# Altium footprint library common.PcbLib: 552 footprints (part 3 of 35)
Each footprint in its own frame and in the unit in brackets; x right, y up, seen from the top. Pads: shape width x height; smd on the part's side, far side on the other; paste and mask are expansions set on the pad; w line width, h text height; cw(c..) or ccw(c..) is an arc to the next point about the centre after c.
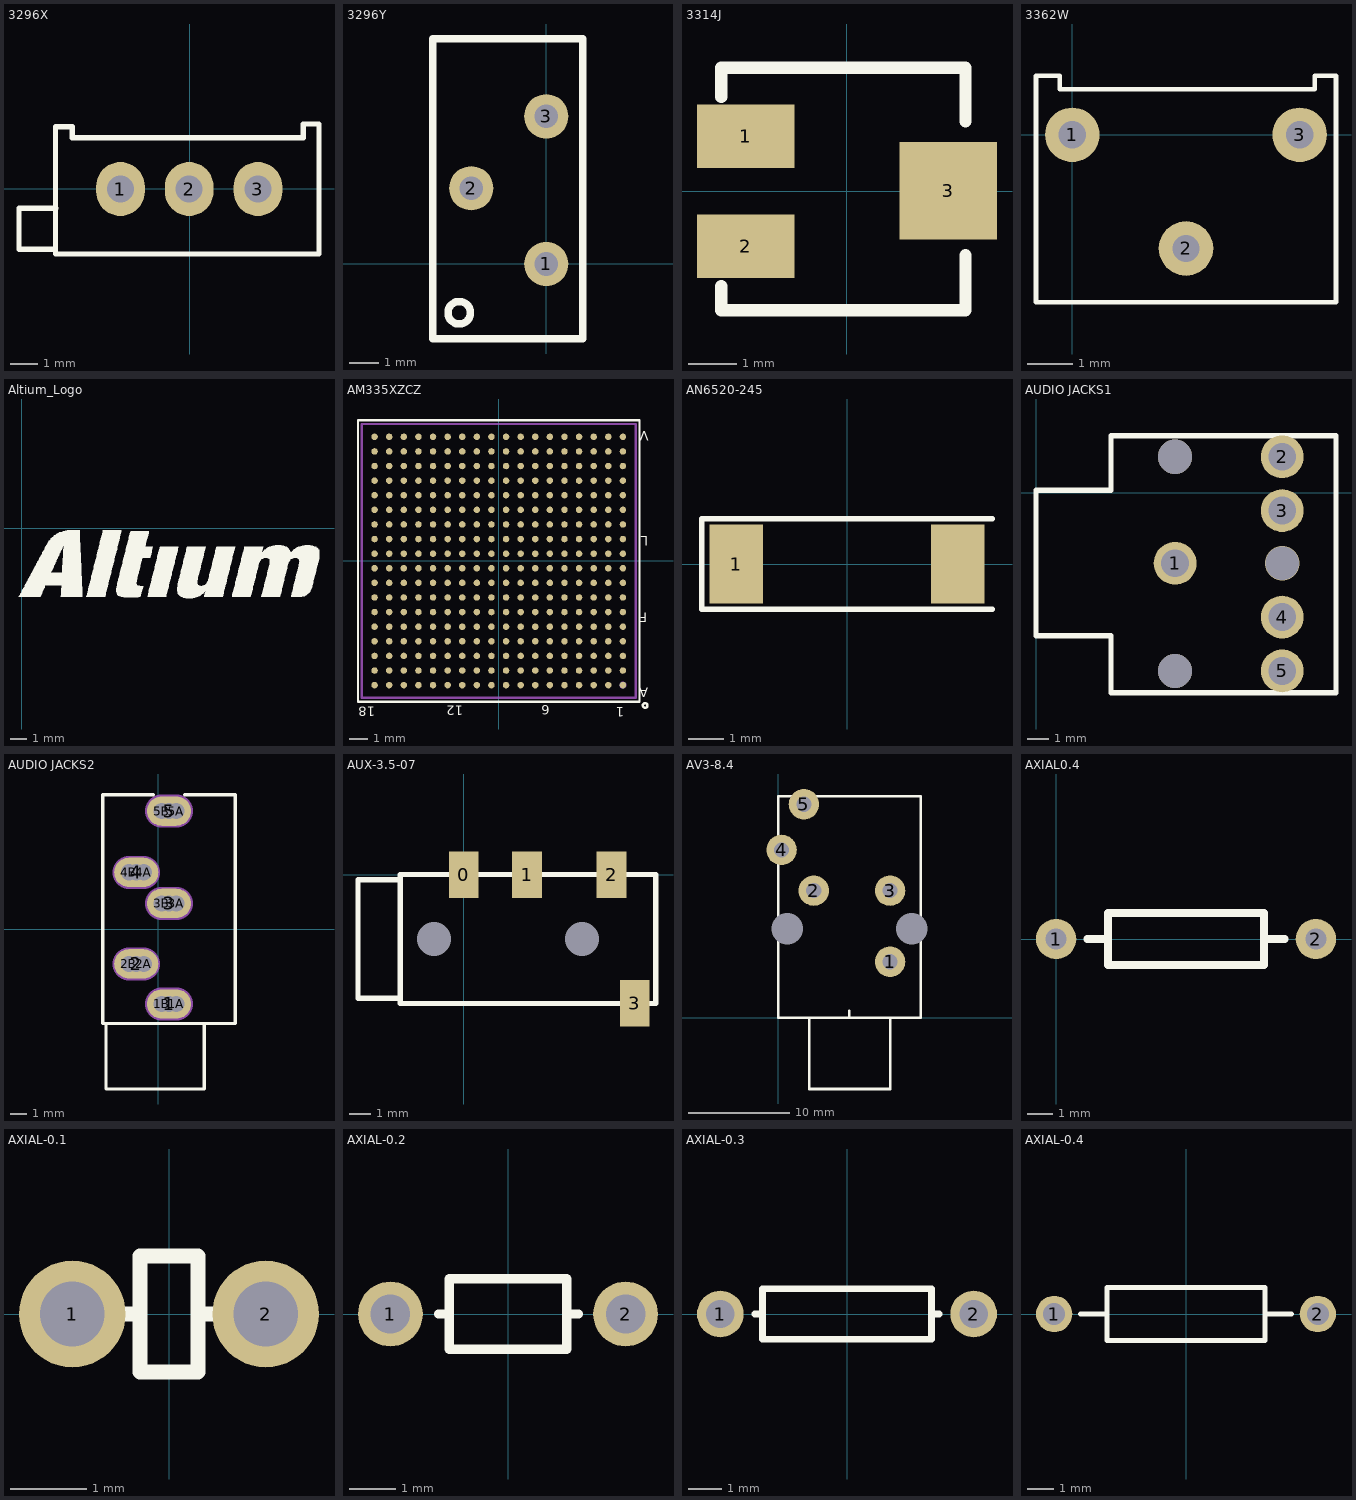
[diagram p2: the footprints below, top view; thin cyan lines are the x and y axes]

## 3296X [mm]
pads (3):
  oval 1.8x2 hole 1: 1(-2.561,-0.001) 2(-0.021,-0.001) 3(2.519,-0.001)
Top Overlay:
  lines w0.2: -5.031,-2.234 -6.309,-2.234 -6.309,-0.717 -4.959,-0.717 ; -4.962,-2.401 -4.962,2.299 -4.339,2.299 -4.339,1.899 -2.861,1.899 -2.261,1.899 -0.321,1.899 0.279,1.899 2.219,1.899 2.819,1.899 4.187,1.899 4.187,2.399 4.775,2.399 4.775,-2.401 3.779,-2.401 -3.821,-2.401 -4.962,-2.401
Mechanical 11:
  circle w0.1: c-2.561,0.009 r0.25
  circle w0.1: c-0.021,0.009 r0.25
  circle w0.1: c2.519,0.009 r0.25
3D body: height 10.03, standoff -2.22, extent -6.301,-2.425 4.749,2.405

## 3296Y [mm]
pads (3):
  round 1.5 hole 0.8: 1(0,0) 2(-2.54,2.565) 3(0,5)
Top Overlay:
  circle w0.254: c-2.946,-1.651 r0.381
  lines w0.254: -3.835,-2.54 -3.835,7.62 1.245,7.62 1.245,-2.54 -3.835,-2.54
3D body: height 11.55, standoff -2.1, extent -3.695,-2.225 1.105,7.305

## 3314J [mm]
pads (3):
  rect 2x1.3 smd: 1(-2.072,1.124) 2(-2.072,-1.124)
  rect 2x2 smd: 3(2.072,0.007)
Top Overlay:
  lines w0.254: -2.578,-1.95 -2.578,-2.436 2.427,-2.436 2.427,-1.31 ; -2.578,1.93 -2.578,2.528 2.427,2.528 2.427,1.429
3D body: height 2.67, standoff -0.06, extent -2.54,-2.423 2.464,2.576

## 3362W [mm]
pads (3):
  round 1.2 hole 0.6: 1(0,0) 2(2.5,-2.5) 3(5,0)
Top Overlay:
  lines w0.1: -0.8,-3.683 5.8,-3.683 5.8,1.3 5.334,1.3 5.334,1 0.864,1 -0.279,1 -0.279,1.3 -0.8,1.3 -0.8,-3.683
3D body: height 7.1, standoff -5.4, extent -0.76,-3.582 5.84,1.118

## Altium_Logo [mm]
Top Overlay:
  drawing of 1243 lines, arcs and shapes, not listed

## AM335XZCZ [mil] "AM335XZCZ"
pads (324):
  round 14 smd: A1(267.72,-267.72) A2(236.22,-267.72) A3(204.72,-267.72) A4(173.23,-267.72) A5(141.73,-267.72) A6(110.24,-267.72) A7(78.74,-267.72) A8(47.24,-267.72) A9(15.75,-267.72) A10(-15.75,-267.72) A11(-47.24,-267.72) A12(-78.74,-267.72) A13(-110.24,-267.72) A14(-141.73,-267.72) A15(-173.23,-267.72) A16(-204.72,-267.72) A17(-236.22,-267.72) A18(-267.72,-267.72) B1(267.72,-236.22) B2(236.22,-236.22) B3(204.72,-236.22) B4(173.23,-236.22) B5(141.73,-236.22) B6(110.24,-236.22) B7(78.74,-236.22) B8(47.24,-236.22) B9(15.75,-236.22) B10(-15.75,-236.22) B11(-47.24,-236.22) B12(-78.74,-236.22) B13(-110.24,-236.22) B14(-141.73,-236.22) B15(-173.23,-236.22) B16(-204.72,-236.22) B17(-236.22,-236.22) B18(-267.72,-236.22) C1(267.72,-204.72) C2(236.22,-204.72) C3(204.72,-204.72) C4(173.23,-204.72) C5(141.73,-204.72) C6(110.24,-204.72) C7(78.74,-204.72) C8(47.24,-204.72) C9(15.75,-204.72) C10(-15.75,-204.72) C11(-47.24,-204.72) C12(-78.74,-204.72) C13(-110.24,-204.72) C14(-141.73,-204.72) C15(-173.23,-204.72) C16(-204.72,-204.72) C17(-236.22,-204.72) C18(-267.72,-204.72) D1(267.72,-173.23) D2(236.22,-173.23) D3(204.72,-173.23) D4(173.23,-173.23) D5(141.73,-173.23) D6(110.24,-173.23) D7(78.74,-173.23) D8(47.24,-173.23) D9(15.75,-173.23) D10(-15.75,-173.23) D11(-47.24,-173.23) D12(-78.74,-173.23) D13(-110.24,-173.23) D14(-141.73,-173.23) D15(-173.23,-173.23) D16(-204.72,-173.23) D17(-236.22,-173.23) D18(-267.72,-173.23) E1(267.72,-141.73) E2(236.22,-141.73) E3(204.72,-141.73) E4(173.23,-141.73) E5(141.73,-141.73) E6(110.24,-141.73) E7(78.74,-141.73) E8(47.24,-141.73) E9(15.75,-141.73) E10(-15.75,-141.73) E11(-47.24,-141.73) E12(-78.74,-141.73) E13(-110.24,-141.73) E14(-141.73,-141.73) E15(-173.23,-141.73) E16(-204.72,-141.73) E17(-236.22,-141.73) E18(-267.72,-141.73) F1(267.72,-110.24) F2(236.22,-110.24) F3(204.72,-110.24) F4(173.23,-110.24) F5(141.73,-110.24) F6(110.24,-110.24) F7(78.74,-110.24) F8(47.24,-110.24) F9(15.75,-110.24) F10(-15.75,-110.24) F11(-47.24,-110.24) F12(-78.74,-110.24) F13(-110.24,-110.24) F14(-141.73,-110.24) F15(-173.23,-110.24) F16(-204.72,-110.24) F17(-236.22,-110.24) F18(-267.72,-110.24) G1(267.72,-78.74) G2(236.22,-78.74) G3(204.72,-78.74) G4(173.23,-78.74) G5(141.73,-78.74) G6(110.24,-78.74) G7(78.74,-78.74) G8(47.24,-78.74) G9(15.75,-78.74) G10(-15.75,-78.74) G11(-47.24,-78.74) G12(-78.74,-78.74) G13(-110.24,-78.74) G14(-141.73,-78.74) G15(-173.23,-78.74) G16(-204.72,-78.74) G17(-236.22,-78.74) G18(-267.72,-78.74) H1(267.72,-47.24) H2(236.22,-47.24) H3(204.72,-47.24) H4(173.23,-47.24) H5(141.73,-47.24) H6(110.24,-47.24) H7(78.74,-47.24) H8(47.24,-47.24) H9(15.75,-47.24) H10(-15.75,-47.24) H11(-47.24,-47.24) H12(-78.74,-47.24) H13(-110.24,-47.24) H14(-141.73,-47.24) H15(-173.23,-47.24) H16(-204.72,-47.24) H17(-236.22,-47.24) H18(-267.72,-47.24) J1(267.72,-15.75) J2(236.22,-15.75) J3(204.72,-15.75) J4(173.23,-15.75) J5(141.73,-15.75) J6(110.24,-15.75) J7(78.74,-15.75) J8(47.24,-15.75) J9(15.75,-15.75) J10(-15.75,-15.75) J11(-47.24,-15.75) J12(-78.74,-15.75) J13(-110.24,-15.75) J14(-141.73,-15.75) J15(-173.23,-15.75) J16(-204.72,-15.75) J17(-236.22,-15.75) J18(-267.72,-15.75) K1(267.72,15.75) K2(236.22,15.75) K3(204.72,15.75) K4(173.23,15.75) K5(141.73,15.75) K6(110.24,15.75) K7(78.74,15.75) K8(47.24,15.75) K9(15.75,15.75) K10(-15.75,15.75) K11(-47.24,15.75) K12(-78.74,15.75) K13(-110.24,15.75) K14(-141.73,15.75) K15(-173.23,15.75) K16(-204.72,15.75) K17(-236.22,15.75) K18(-267.72,15.75) L1(267.72,47.24) L2(236.22,47.24) L3(204.72,47.24) L4(173.23,47.24) L5(141.73,47.24) L6(110.24,47.24) L7(78.74,47.24) L8(47.24,47.24) L9(15.75,47.24) L10(-15.75,47.24) L11(-47.24,47.24) L12(-78.74,47.24) L13(-110.24,47.24) L14(-141.73,47.24) L15(-173.23,47.24) L16(-204.72,47.24) L17(-236.22,47.24) L18(-267.72,47.24) M1(267.72,78.74) M2(236.22,78.74) M3(204.72,78.74) M4(173.23,78.74) M5(141.73,78.74) M6(110.24,78.74) M7(78.74,78.74) M8(47.24,78.74) M9(15.75,78.74) M10(-15.75,78.74) M11(-47.24,78.74) M12(-78.74,78.74) M13(-110.24,78.74) M14(-141.73,78.74) M15(-173.23,78.74) M16(-204.72,78.74) M17(-236.22,78.74) M18(-267.72,78.74) N1(267.72,110.24) N2(236.22,110.24) N3(204.72,110.24) N4(173.23,110.24) N5(141.73,110.24) N6(110.24,110.24) N7(78.74,110.24) N8(47.24,110.24) N9(15.75,110.24) N10(-15.75,110.24) N11(-47.24,110.24) N12(-78.74,110.24) N13(-110.24,110.24) N14(-141.73,110.24) N15(-173.23,110.24) N16(-204.72,110.24) N17(-236.22,110.24) N18(-267.72,110.24) P1(267.72,141.73) P2(236.22,141.73) P3(204.72,141.73) P4(173.23,141.73) P5(141.73,141.73) P6(110.24,141.73) P7(78.74,141.73) P8(47.24,141.73) P9(15.75,141.73) P10(-15.75,141.73) P11(-47.24,141.73) P12(-78.74,141.73) P13(-110.24,141.73) P14(-141.73,141.73) P15(-173.23,141.73) P16(-204.72,141.73) P17(-236.22,141.73) P18(-267.72,141.73) R1(267.72,173.23) R2(236.22,173.23) R3(204.72,173.23) R4(173.23,173.23) R5(141.73,173.23) R6(110.24,173.23) R7(78.74,173.23) R8(47.24,173.23) R9(15.75,173.23) R10(-15.75,173.23) R11(-47.24,173.23) R12(-78.74,173.23) R13(-110.24,173.23) R14(-141.73,173.23) R15(-173.23,173.23) R16(-204.72,173.23) R17(-236.22,173.23) R18(-267.72,173.23) T1(267.72,204.72) T2(236.22,204.72) T3(204.72,204.72) T4(173.23,204.72) T5(141.73,204.72) T6(110.24,204.72) T7(78.74,204.72) T8(47.24,204.72) T9(15.75,204.72) T10(-15.75,204.72) T11(-47.24,204.72) T12(-78.74,204.72) T13(-110.24,204.72) T14(-141.73,204.72) T15(-173.23,204.72) T16(-204.72,204.72) T17(-236.22,204.72) T18(-267.72,204.72) U1(267.72,236.22) U2(236.22,236.22) U3(204.72,236.22) U4(173.23,236.22) U5(141.73,236.22) U6(110.24,236.22) U7(78.74,236.22) U8(47.24,236.22) U9(15.75,236.22) U10(-15.75,236.22) U11(-47.24,236.22) U12(-78.74,236.22) U13(-110.24,236.22) U14(-141.73,236.22) U15(-173.23,236.22) U16(-204.72,236.22) U17(-236.22,236.22) U18(-267.72,236.22) V1(267.72,267.72) V2(236.22,267.72) V3(204.72,267.72) V4(173.23,267.72) V5(141.73,267.72) V6(110.24,267.72) V7(78.74,267.72) V8(47.24,267.72) V9(15.75,267.72) V10(-15.75,267.72) V11(-47.24,267.72) V12(-78.74,267.72) V13(-110.24,267.72) V14(-141.73,267.72) V15(-173.23,267.72) V16(-204.72,267.72) V17(-236.22,267.72) V18(-267.72,267.72)
Top Overlay:
  circle w5: c315.67,-311.62 r5
  lines w5: -303.5,-303.5 -303.5,303.5 303.5,303.5 303.5,-303.5 -303.5,-303.5
  text "18" at -266.24,-314.49 h20.08
  text "12" at -76.87,-312.08 h20.08
  text "6" at 110.08,-310.87 h20.08
  text "L" at 322.19,52.93 h20.08
  text "F" at 319.96,-111.85 h20.08
  text "1" at 270.95,-315.2 h20.08
  text "V" at 323.32,279.77 h20.08
  text "A" at 322.86,-273.73 h20.08
Mechanical 13:
  text "J2" at 220.16,-15.75 h20.08
  text "L1" at 251.66,47.24 h20.08
  text "L2" at 220.16,47.24 h20.08
  text "B6" at 94.18,-236.22 h20.08
  text "D7" at 62.68,-173.23 h20.08
  text "C18" at -291.82,-204.72 h20.08
  text "F15" at -197.33,-110.24 h20.08
  text "P17" at -260.32,141.73 h20.08
  text "R18" at -291.82,173.23 h20.08
  text "R17" at -260.32,173.23 h20.08
  text "B4" at 157.17,-236.22 h20.08
  text "C17" at -260.32,-204.72 h20.08
  text "C16" at -228.82,-204.72 h20.08
  text "D6" at 94.18,-173.23 h20.08
  text "R13" at -134.34,173.23 h20.08
  text "D16" at -228.82,-173.23 h20.08
  text "D15" at -197.33,-173.23 h20.08
  text "J3" at 188.66,-15.75 h20.08
  text "E5" at 125.67,-141.73 h20.08
  text "J5" at 125.67,-15.75 h20.08
  text "K5" at 125.67,15.75 h20.08
  text "L5" at 125.67,47.24 h20.08
  text "G5" at 125.67,-78.74 h20.08
  text "F5" at 125.67,-110.24 h20.08
  text "H5" at 125.67,-47.24 h20.08
  text "E17" at -260.32,-141.73 h20.08
  text "J4" at 157.17,-15.75 h20.08
  text "E15" at -197.33,-141.73 h20.08
  text "G10" at -39.85,-78.74 h20.08
  text "H11" at -71.34,-47.24 h20.08
  text "M11" at -71.34,78.74 h20.08
  text "M13" at -134.34,78.74 h20.08
  text "N12" at -102.84,110.24 h20.08
  text "N13" at -134.34,110.24 h20.08
  text "K12" at -102.84,15.75 h20.08
  text "J12" at -102.84,-15.75 h20.08
  text "G6" at 94.18,-78.74 h20.08
  text "G7" at 62.68,-78.74 h20.08
  text "F6" at 94.18,-110.24 h20.08
  text "F7" at 62.68,-110.24 h20.08
  text "L8" at 31.18,47.24 h20.08
  text "L9" at -0.31,47.24 h20.08
  text "K8" at 31.18,15.75 h20.08
  text "L6" at 94.18,47.24 h20.08
  text "L7" at 62.68,47.24 h20.08
  text "K6" at 94.18,15.75 h20.08
  text "N9" at -0.31,110.24 h20.08
  text "N8" at 31.18,110.24 h20.08
  text "E16" at -228.82,-141.73 h20.08
  text "M1" at 251.66,78.74 h20.08
  text "L4" at 157.17,47.24 h20.08
  text "L3" at 188.66,47.24 h20.08
  text "K4" at 157.17,15.75 h20.08
  text "K3" at 188.66,15.75 h20.08
  text "K2" at 220.16,15.75 h20.08
  text "K1" at 251.66,15.75 h20.08
  text "J1" at 251.66,-15.75 h20.08
  text "P4" at 157.17,141.73 h20.08
  text "P3" at 188.66,141.73 h20.08
  text "A18" at -291.82,-267.72 h20.08
  text "V18" at -291.82,267.72 h20.08
  text "N11" at -71.34,110.24 h20.08
  text "N10" at -39.85,110.24 h20.08
  text "F8" at 31.18,-110.24 h20.08
  text "H7" at 62.68,-47.24 h20.08
  text "H6" at 94.18,-47.24 h20.08
  text "J7" at 62.68,-15.75 h20.08
  text "J6" at 94.18,-15.75 h20.08
  text "K7" at 62.68,15.75 h20.08
  text "H10" at -39.85,-47.24 h20.08
  text "J11" at -71.34,-15.75 h20.08
  text "J10" at -39.85,-15.75 h20.08
  text "K11" at -71.34,15.75 h20.08
  text "K10" at -39.85,15.75 h20.08
  text "M14" at -165.83,78.74 h20.08
  text "N14" at -165.83,110.24 h20.08
  text "L13" at -134.34,47.24 h20.08
  text "L12" at -102.84,47.24 h20.08
  text "M12" at -102.84,78.74 h20.08
  text "M10" at -39.85,78.74 h20.08
  text "L10" at -39.85,47.24 h20.08
  text "L11" at -71.34,47.24 h20.08
  text "M9" at -0.31,78.74 h20.08
  text "M8" at 31.18,78.74 h20.08
  text "M7" at 62.68,78.74 h20.08
  text "M6" at 94.18,78.74 h20.08
  text "N7" at 62.68,110.24 h20.08
  text "G8" at 31.18,-78.74 h20.08
  text "G9" at -0.31,-78.74 h20.08
  text "H8" at 31.18,-47.24 h20.08
  text "H9" at -0.31,-47.24 h20.08
  text "K9" at -0.31,15.75 h20.08
  text "J8" at 31.18,-15.75 h20.08
  text "J9" at -0.31,-15.75 h20.08
  text "V1" at 251.66,267.72 h20.08
  text "H12" at -102.84,-47.24 h20.08
  text "G11" at -71.34,-78.74 h20.08
  text "G12" at -102.84,-78.74 h20.08
  text "A1" at 251.66,-267.72 h20.08
  text "N4" at 157.17,110.24 h20.08
  text "N3" at 188.66,110.24 h20.08
  text "N2" at 220.16,110.24 h20.08
  text "N1" at 251.66,110.24 h20.08
  text "M4" at 157.17,78.74 h20.08
  text "M3" at 188.66,78.74 h20.08
  text "H4" at 157.17,-47.24 h20.08
  text "H3" at 188.66,-47.24 h20.08
  text "E3" at 188.66,-141.73 h20.08
  text "F2" at 220.16,-110.24 h20.08
  text "F4" at 157.17,-110.24 h20.08
  text "C1" at 251.66,-204.72 h20.08
  text "D4" at 157.17,-173.23 h20.08
  text "E2" at 220.16,-141.73 h20.08
  text "D5" at 125.67,-173.23 h20.08
  text "B1" at 251.66,-236.22 h20.08
  text "U17" at -260.32,236.22 h20.08
  text "C2" at 220.16,-204.72 h20.08
  text "T17" at -260.32,204.72 h20.08
  text "C3" at 188.66,-204.72 h20.08
  text "U18" at -291.82,236.22 h20.08
  text "E4" at 157.17,-141.73 h20.08
  text "T6" at 94.18,204.72 h20.08
  text "H1" at 251.66,-47.24 h20.08
  text "R7" at 62.68,173.23 h20.08
  text "F3" at 188.66,-110.24 h20.08
  text "A2" at 220.16,-267.72 h20.08
  text "J13" at -134.34,-15.75 h20.08
  text "G13" at -134.34,-78.74 h20.08
  text "H13" at -134.34,-47.24 h20.08
  text "F12" at -102.84,-110.24 h20.08
  text "F13" at -134.34,-110.24 h20.08
  text "F11" at -71.34,-110.24 h20.08
  text "F10" at -39.85,-110.24 h20.08
  text "T7" at 62.68,204.72 h20.08
  text "U6" at 94.18,236.22 h20.08
  text "V6" at 94.18,267.72 h20.08
  text "F17" at -260.32,-110.24 h20.08
  text "F18" at -291.82,-110.24 h20.08
  text "G16" at -228.82,-78.74 h20.08
  text "G18" at -291.82,-78.74 h20.08
  text "G17" at -260.32,-78.74 h20.08
  text "D14" at -165.83,-173.23 h20.08
  text "C10" at -39.85,-204.72 h20.08
  text "A15" at -197.33,-267.72 h20.08
  text "D11" at -71.34,-173.23 h20.08
  text "B18" at -291.82,-236.22 h20.08
  text "D9" at -0.31,-173.23 h20.08
  text "B5" at 125.67,-236.22 h20.08
  text "R5" at 125.67,173.23 h20.08
  text "A10" at -39.85,-267.72 h20.08
  text "U5" at 125.67,236.22 h20.08
  text "B15" at -197.33,-236.22 h20.08
  text "V5" at 125.67,267.72 h20.08
  text "N15" at -197.33,110.24 h20.08
  text "R15" at -197.33,173.23 h20.08
  text "G2" at 220.16,-78.74 h20.08
  text "G1" at 251.66,-78.74 h20.08
  text "P2" at 220.16,141.73 h20.08
  text "P1" at 251.66,141.73 h20.08
  text "M2" at 220.16,78.74 h20.08
  text "B2" at 220.16,-236.22 h20.08
  text "G4" at 157.17,-78.74 h20.08
  text "F1" at 251.66,-110.24 h20.08
  text "H2" at 220.16,-47.24 h20.08
  text "B14" at -165.83,-236.22 h20.08
  text "G3" at 188.66,-78.74 h20.08
  text "C14" at -165.83,-204.72 h20.08
  text "D1" at 251.66,-173.23 h20.08
  text "A11" at -71.34,-267.72 h20.08
  text "D2" at 220.16,-173.23 h20.08
  text "A12" at -102.84,-267.72 h20.08
  text "B11" at -71.34,-236.22 h20.08
  text "T5" at 125.67,204.72 h20.08
  text "C11" at -71.34,-204.72 h20.08
  text "V4" at 157.17,267.72 h20.08
  text "B10" at -39.85,-236.22 h20.08
  text "V3" at 188.66,267.72 h20.08
  text "V2" at 220.16,267.72 h20.08
  text "U4" at 157.17,236.22 h20.08
  text "U3" at 188.66,236.22 h20.08
  text "U2" at 220.16,236.22 h20.08
  text "U1" at 251.66,236.22 h20.08
  text "T4" at 157.17,204.72 h20.08
  text "T3" at 188.66,204.72 h20.08
  text "T2" at 220.16,204.72 h20.08
  text "T1" at 251.66,204.72 h20.08
  text "R4" at 157.17,173.23 h20.08
  text "R3" at 188.66,173.23 h20.08
  text "R2" at 220.16,173.23 h20.08
  text "H18" at -291.82,-47.24 h20.08
  text "J15" at -197.33,-15.75 h20.08
  text "U16" at -228.82,236.22 h20.08
  text "T16" at -228.82,204.72 h20.08
  text "V17" at -260.32,267.72 h20.08
  text "V16" at -228.82,267.72 h20.08
  text "T15" at -197.33,204.72 h20.08
  text "U15" at -197.33,236.22 h20.08
  text "V15" at -197.33,267.72 h20.08
  text "R14" at -165.83,173.23 h20.08
  text "H15" at -197.33,-47.24 h20.08
  text "K13" at -134.34,15.75 h20.08
  text "R10" at -39.85,173.23 h20.08
  text "R11" at -71.34,173.23 h20.08
  text "R16" at -228.82,173.23 h20.08
  text "P14" at -165.83,141.73 h20.08
  text "N6" at 94.18,110.24 h20.08
  text "P9" at -0.31,141.73 h20.08
  text "E7" at 62.68,-141.73 h20.08
  text "E6" at 94.18,-141.73 h20.08
  text "D10" at -39.85,-173.23 h20.08
  text "E9" at -0.31,-141.73 h20.08
  text "F9" at -0.31,-110.24 h20.08
  text "D8" at 31.18,-173.23 h20.08
  text "B9" at -0.31,-236.22 h20.08
  text "E14" at -165.83,-141.73 h20.08
  text "N16" at -228.82,110.24 h20.08
  text "B3" at 188.66,-236.22 h20.08
  text "T14" at -165.83,204.72 h20.08
  text "E1" at 251.66,-141.73 h20.08
  text "U14" at -165.83,236.22 h20.08
  text "C4" at 157.17,-204.72 h20.08
  text "V14" at -165.83,267.72 h20.08
  text "U9" at -0.31,236.22 h20.08
  text "R1" at 251.66,173.23 h20.08
  text "M17" at -260.32,78.74 h20.08
  text "M18" at -291.82,78.74 h20.08
  text "A5" at 125.67,-267.72 h20.08
  text "J17" at -260.32,-15.75 h20.08
  text "V11" at -71.34,267.72 h20.08
  text "V13" at -134.34,267.72 h20.08
  text "A4" at 157.17,-267.72 h20.08
  text "L17" at -260.32,47.24 h20.08
  text "R12" at -102.84,173.23 h20.08
  text "A6" at 94.18,-267.72 h20.08
  text "L16" at -228.82,47.24 h20.08
  text "T12" at -102.84,204.72 h20.08
  text "L15" at -197.33,47.24 h20.08
  text "U12" at -102.84,236.22 h20.08
  text "M16" at -228.82,78.74 h20.08
  text "T11" at -71.34,204.72 h20.08
  text "L18" at -291.82,47.24 h20.08
  text "T10" at -39.85,204.72 h20.08
  text "H16" at -228.82,-47.24 h20.08
  text "U10" at -39.85,236.22 h20.08
  text "H17" at -260.32,-47.24 h20.08
  text "T9" at -0.31,204.72 h20.08
  text "J16" at -228.82,-15.75 h20.08
  text "R9" at -0.31,173.23 h20.08
  text "J18" at -291.82,-15.75 h20.08
  text "D13" at -134.34,-173.23 h20.08
  text "V8" at 31.18,267.72 h20.08
  text "K15" at -197.33,15.75 h20.08
  text "C13" at -134.34,-204.72 h20.08
  text "U8" at 31.18,236.22 h20.08
  text "K16" at -228.82,15.75 h20.08
  text "T8" at 31.18,204.72 h20.08
  text "K17" at -260.32,15.75 h20.08
  text "C12" at -102.84,-204.72 h20.08
  text "R8" at 31.18,173.23 h20.08
  text "K18" at -291.82,15.75 h20.08
  text "D12" at -102.84,-173.23 h20.08
  text "V7" at 62.68,267.72 h20.08
  text "B13" at -134.34,-236.22 h20.08
  text "U7" at 62.68,236.22 h20.08
  text "U11" at -71.34,236.22 h20.08
  text "A13" at -134.34,-267.72 h20.08
  text "V10" at -39.85,267.72 h20.08
  text "A14" at -165.83,-267.72 h20.08
  text "J14" at -165.83,-15.75 h20.08
  text "H14" at -165.83,-47.24 h20.08
  text "U13" at -134.34,236.22 h20.08
  text "E18" at -291.82,-141.73 h20.08
  text "C15" at -197.33,-204.72 h20.08
  text "T18" at -291.82,204.72 h20.08
  text "G15" at -197.33,-78.74 h20.08
  text "B16" at -228.82,-236.22 h20.08
  text "B17" at -260.32,-236.22 h20.08
  text "A17" at -260.32,-267.72 h20.08
  text "A16" at -228.82,-267.72 h20.08
  text "D17" at -260.32,-173.23 h20.08
  text "D18" at -291.82,-173.23 h20.08
  text "R6" at 94.18,173.23 h20.08
  text "C9" at -0.31,-204.72 h20.08
  text "A8" at 31.18,-267.72 h20.08
  text "B8" at 31.18,-236.22 h20.08
  text "C8" at 31.18,-204.72 h20.08
  text "A7" at 62.68,-267.72 h20.08
  text "B7" at 62.68,-236.22 h20.08
  text "C7" at 62.68,-204.72 h20.08
  text "D3" at 188.66,-173.23 h20.08
  text "V12" at -102.84,267.72 h20.08
  text "V9" at -0.31,267.72 h20.08
  text "T13" at -134.34,204.72 h20.08
  text "B12" at -102.84,-236.22 h20.08
  text "C6" at 94.18,-204.72 h20.08
  text "M15" at -197.33,78.74 h20.08
  text "N18" at -291.82,110.24 h20.08
  text "N17" at -260.32,110.24 h20.08
  text "F16" at -228.82,-110.24 h20.08
  text "P16" at -228.82,141.73 h20.08
  text "P15" at -197.33,141.73 h20.08
  text "P18" at -291.82,141.73 h20.08
  text "A3" at 188.66,-267.72 h20.08
  text "M5" at 125.67,78.74 h20.08
  text "C5" at 125.67,-204.72 h20.08
  text "A9" at -0.31,-267.72 h20.08
  text "E8" at 31.18,-141.73 h20.08
  text "K14" at -165.83,15.75 h20.08
  text "L14" at -165.83,47.24 h20.08
  text "P10" at -39.85,141.73 h20.08
  text "P11" at -71.34,141.73 h20.08
  text "P13" at -134.34,141.73 h20.08
  text "P12" at -102.84,141.73 h20.08
  text "N5" at 125.67,110.24 h20.08
  text "P6" at 94.18,141.73 h20.08
  text "P5" at 125.67,141.73 h20.08
  text "P7" at 62.68,141.73 h20.08
  text "P8" at 31.18,141.73 h20.08
  text "E10" at -39.85,-141.73 h20.08
  text "E11" at -71.34,-141.73 h20.08
  text "F14" at -165.83,-110.24 h20.08
  text "G14" at -165.83,-78.74 h20.08
  text "E12" at -102.84,-141.73 h20.08
  text "E13" at -134.34,-141.73 h20.08
Mechanical 15:
  circle w5: c267.75,-267.64 r5
  lines w5: -295.28,-295.28 295.28,-295.28 295.28,295.28 -295.28,295.28 -295.28,-295.28
  text "A" at 308.5,-274.13 h20.08
  text "18" at -266.49,-314.32 h20.08
  text "12" at -77.21,-312.18 h20.08
  text "6" at 110.21,-310.55 h20.08
  text "L" at 322.18,50.52 h20.08
  text "F" at 320.02,-111.53 h20.08
  text "V" at 323.32,279.77 h20.08
  text "1" at 270.97,-315.13 h20.08
3D body: height 45, standoff 10, extent -295,-295 300,300

## AN6520-245 [mm]
height 1.2
pads (2):
  rect 1.5x2.2 smd: 1(-3.1,0) ""(3.1,0)
Top Overlay:
  lines w0.152: 4.064,-1.27 -4.064,-1.27 -4.064,1.27 4.064,1.27
3D body: height 1.2, standoff 0, extent -3.25,-1.092 3.25,1.108

## AUDIO JACKS1 [mm]
pads (5):
  round 2 hole 1.3: 1(6.502,-3.302) 2(11.506,1.676) 3(11.506,-0.838) 4(11.506,-5.817) 5(11.506,-8.331)
via 6.502,1.676 diameter 1.6 hole 1.6
via 6.502,-8.331 diameter 1.6 hole 1.6
via 11.506,-3.302 diameter 1.6 hole 1.56
Top Overlay:
  lines w0.254: 0,-6.68 3.505,-6.68 3.505,-9.347 14.021,-9.347 14.021,2.667 3.505,2.667 3.505,0.102 0,0.102 0,-6.68
3D body: height 11.1, standoff -3.9, extent 0.011,-9.377 15.011,2.823

## AUDIO JACKS2 [mm]
pads (15):
  oval 2.7x1.8 hole 1: 1(0.672,-4.579) 2(-1.328,-2.129) 3(0.672,1.571) 4(-1.328,3.471) 5(0.672,7.221)
  round 1.2 hole 1: 1A(1.122,-4.579) 1B(0.222,-4.579) 2A(-0.878,-2.129) 2B(-1.778,-2.129) 3A(1.122,1.571) 3B(0.222,1.571) 4A(-0.878,3.471) 4B(-1.778,3.471) 5A(1.122,7.221) 5B(0.222,7.221)
Top Overlay:
  lines w0.2: -3.178,-5.779 -3.178,-9.779 2.822,-9.779 2.822,-5.779 ; -0.278,8.221 -3.378,8.221 -3.378,-5.779 4.722,-5.779 4.722,8.221 1.622,8.221
Mechanical 2:
  lines w2.016: -1.778,-2.129 -0.878,-2.129 ; -1.778,3.471 -0.878,3.471 ; 0.222,-4.579 1.122,-4.579 ; 0.222,1.571 1.122,1.571 ; 0.222,7.221 1.122,7.221
3D body: height 5.3, standoff -10.3, extent -3.478,-9.779 4.722,8.221

## AUX-3.5-07 [mm]
pads (6):
  rect 1.4x2.2 smd: 0(-0.012,0) 1(2.988,0) 2(6.988,0) 3(8.088,-6.1)
  round 1 hole 1.6: ""(-1.412,-3.05) ""(5.588,-3.05)
Top Overlay:
  lines w0.254: -3.012,-5.85 -5.012,-5.85 -5.012,-0.25 -3.012,-0.25 ; -3.012,-5.85 -3.012,-0.25 ; -3.012,-5.85 -3.012,-6.1 9.088,-6.1 9.088,0 -3.012,0 -3.012,-0.25
3D body: height 4.06, standoff -0.01, extent -4.178,-6.507 7.792,0.827

## AV3-8.4 [mm]
pads (7):
  round 3 hole 1.5: 1(11,5.5) 2(3.5,12.5) 3(11,12.5) 4(0.325,16.5) 5(2.525,21)
  round 3 hole 3.1 unplated: ""(0.9,8.75) ""(13.15,8.75)
Top Overlay:
  lines w0.254: 3.04,0 3.04,-7.02 11.02,-7.02 11.02,0 ; 7,0 7,0.66 ; 0,0 14,0 14,21.8 0,21.8 0,0
3D body: height 40.92, standoff -4.32, extent 0.3,-8.208 17.115,23.008

## AXIAL0.4 [mil] "此模型引用\"王千会\"作品，特此声明"
height 47.24
pads (2):
  round 62 hole 32: 1(0,0) 2(400,0)
Top Overlay:
  lines w12: 48,0 80,0 ; 320,0 352,0 ; 80,-40 80,40 320,40 320,-40 80,-40
3D body: height 101.42, standoff -60, extent -12.6,-47.24 412.6,47.24

## AXIAL-0.1 [mm] "Axial Device, Resistor , Thru-Hole; 2 Leads; 0.1 in Pin Spacing"
height 1.524
pads (2):
  round 1.4 hole 0.85: 1(-1.27,0) 2(1.27,0)
Top Overlay:
  lines w0.2: -0.635,0 -0.406,0 ; 0.762,0 0.381,0 ; 0.381,0 0.381,-0.762 -0.381,-0.762 -0.381,0.762 0.381,0.762 0.381,0
3D body: height 6.85, standoff -1.9, extent -2.188,-0.952 1.524,0.889

## AXIAL-0.2 [mm] "Axial Device, Resistor , Thru-Hole; 2 Leads; 0.3 in Pin Spacing"
height 1.524
pads (2):
  round 1.4 hole 0.85: 1(-2.54,0) 2(2.54,0)
Top Overlay:
  lines w0.2: -1.499,0 -1.27,0 ; 1.524,0 1.27,0 ; 1.27,0 1.27,0.762 -1.27,0.762 -1.27,-0.762 1.27,-0.762 1.27,0
3D body: height 2.91, standoff -2, extent -2.794,-0.889 2.736,0.931

## AXIAL-0.3 [mm] "1/8W"
height 1.524
pads (2):
  round 1.4 hole 0.85: 1(-3.81,0) 2(3.81,0)
Top Overlay:
  lines w0.2: -2.769,0 -2.54,0 ; 2.769,0 2.54,0 ; 2.54,0 2.54,-0.762 -2.54,-0.762 -2.54,0.762 2.54,0.762 2.54,0
3D body: height 2.36, standoff -1.15, extent -4.064,-0.971 4.064,0.971

## AXIAL-0.4 [mm] "1/4W/1/2W"
height 2.032
pads (2):
  round 1.4 hole 0.85: 1(-5.08,0) 2(5.08,0)
Top Overlay:
  lines w0.2: -4.064,0 -3.048,0 ; 3.048,0 4.064,0 ; -3.048,-1.016 3.048,-1.016 3.048,1.016 -3.048,1.016 -3.048,-1.016
3D body: height 3.26, standoff -2, extent -5.38,-1.26 5.38,1.26